# Altium footprint library 隔离DCDC电源模块.PcbLib: 3 footprints
Each footprint in its own frame and in the unit in brackets; x right, y up, seen from the top. Pads: shape width x height; smd on the part's side, far side on the other; paste and mask are expansions set on the pad; w line width, h text height; cw(c..) or ccw(c..) is an arc to the next point about the centre after c.
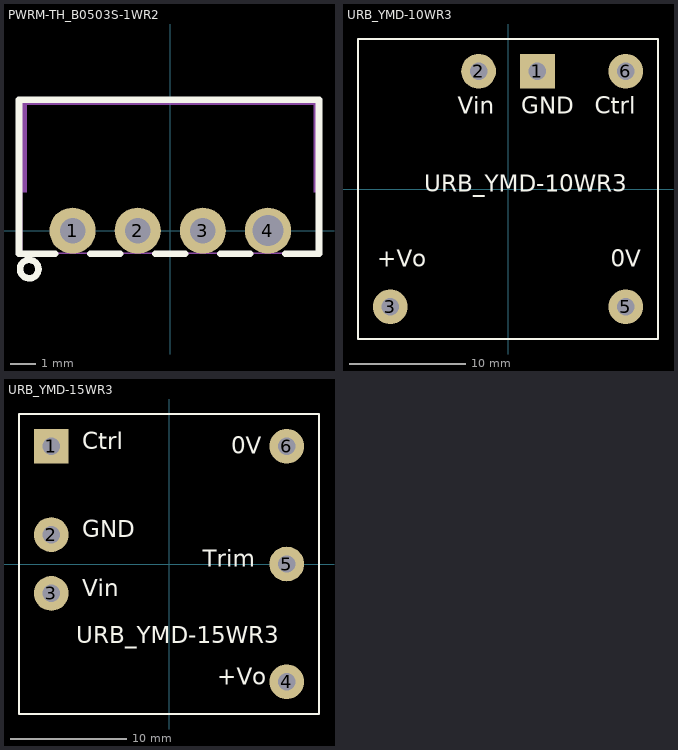
[diagram p0: the footprints below, top view; thin cyan lines are the x and y axes]

## PWRM-TH_B0503S-1WR2 [mm]
pads (4):
  round 1.8 hole 1: 1(-3.81,0) 2(-1.27,0) 3(1.27,0)
  round 1.8 hole 1.2: 4(3.81,0)
Top Overlay:
  circle w0.254: c-5.5,-1.5 r0.361
  lines w0.254: -5.9,5.1 -5.9,-0.9 -4.494,-0.9 ; -5.8,5.1 5.8,5.1 5.8,-0.9 4.494,-0.9 ; -3.126,-0.9 -1.954,-0.9 ; -0.586,-0.9 0.586,-0.9 ; 1.954,-0.9 3.126,-0.9
Mechanical 6:
  region: -5.8,5.1 5.8,5.1 5.8,1.5 5.6,1.5 5.6,4.9 -5.6,4.9 -5.6,1.5 -5.8,1.5
Mechanical 15:
  region: -4.06,0.15 -3.56,0.15 -3.56,-0.15 -4.06,-0.15
  region: -1.52,0.15 -1.02,0.15 -1.02,-0.15 -1.52,-0.15
  region: 1.02,0.15 1.52,0.15 1.52,-0.15 1.02,-0.15
  region: 3.56,0.15 4.06,0.15 4.06,-0.15 3.56,-0.15
  region: -5.74,-0.892 -5.741,-0.867 -5.776,-0.833 -5.825,-0.833 -5.86,-0.867 -5.86,-0.892 -5.86,-0.916 -5.825,-0.951 -5.776,-0.951 -5.741,-0.916
  lines w0.051: -5.8,-0.892 5.8,-0.892 5.8,5.108 -5.8,5.108 -5.8,-0.892
3D body "U1.step": height 10.16, standoff -3.5, extent -5.8,-0.897 5.8,5.103

## URB_YMD-10WR3 [mm]
pads (5):
  rect 3x3 hole 1.5: 1(2.54,10.16)
  round 3 hole 1.5: 2(-2.54,10.16) 3(-10.16,-10.16) 5(10.16,-10.16) 6(10.16,10.16)
Top Overlay:
  lines w0.2: -12.95,-12.95 12.95,-12.95 12.95,12.95 -12.95,12.95 -12.95,-12.95
  text "Ctrl" at 7.493,5.969 h2.5
  text "0V" at 8.89,-7.239 h2.5
  text "GND" at 1.143,5.969 h2.5
  text "Vin" at -4.318,5.969 h2.5
  text "+Vo" at -11.303,-7.209 h2.5
  text "URB_YMD-10WR3" at -7.239,-0.762 h2.5
3D body "U8.step": height 11.81, standoff -4, extent -12.75,-12.75 12.75,12.75

## URB_YMD-15WR3 [mm]
pads (6):
  rect 3x3 hole 1.5: 1(-10.16,10.16)
  round 3 hole 1.5: 2(-10.16,2.54) 3(-10.16,-2.54) 4(10.16,-10.16) 5(10.16,0) 6(10.16,10.16)
Top Overlay:
  lines w0.2: -12.95,-12.95 -12.95,12.95 12.95,12.95 12.95,-12.95 -12.95,-12.95
  text "0V" at 5.392,9.017 h2.5
  text "Ctrl" at -7.493,9.398 h2.5
  text "URB_YMD-15WR3" at -8.001,-7.366 h2.5
  text "GND" at -7.493,1.778 h2.5
  text "Vin" at -7.495,-3.302 h2.5
  text "+Vo" at 4.161,-10.922 h2.5
  text "Trim" at 2.921,-0.762 h2.5
3D body "URB_YMD-15WR3.stp": height 11.98, standoff -3.87, extent -12.7,-12.7 12.7,12.75